# Altium footprint library LukaLIBRARY.PcbLib: 784 footprints (part 18 of 49)
Each footprint in its own frame and in the unit in brackets; x right, y up, seen from the top. Pads: shape width x height; smd on the part's side, far side on the other; paste and mask are expansions set on the pad; w line width, h text height; cw(c..) or ccw(c..) is an arc to the next point about the centre after c.
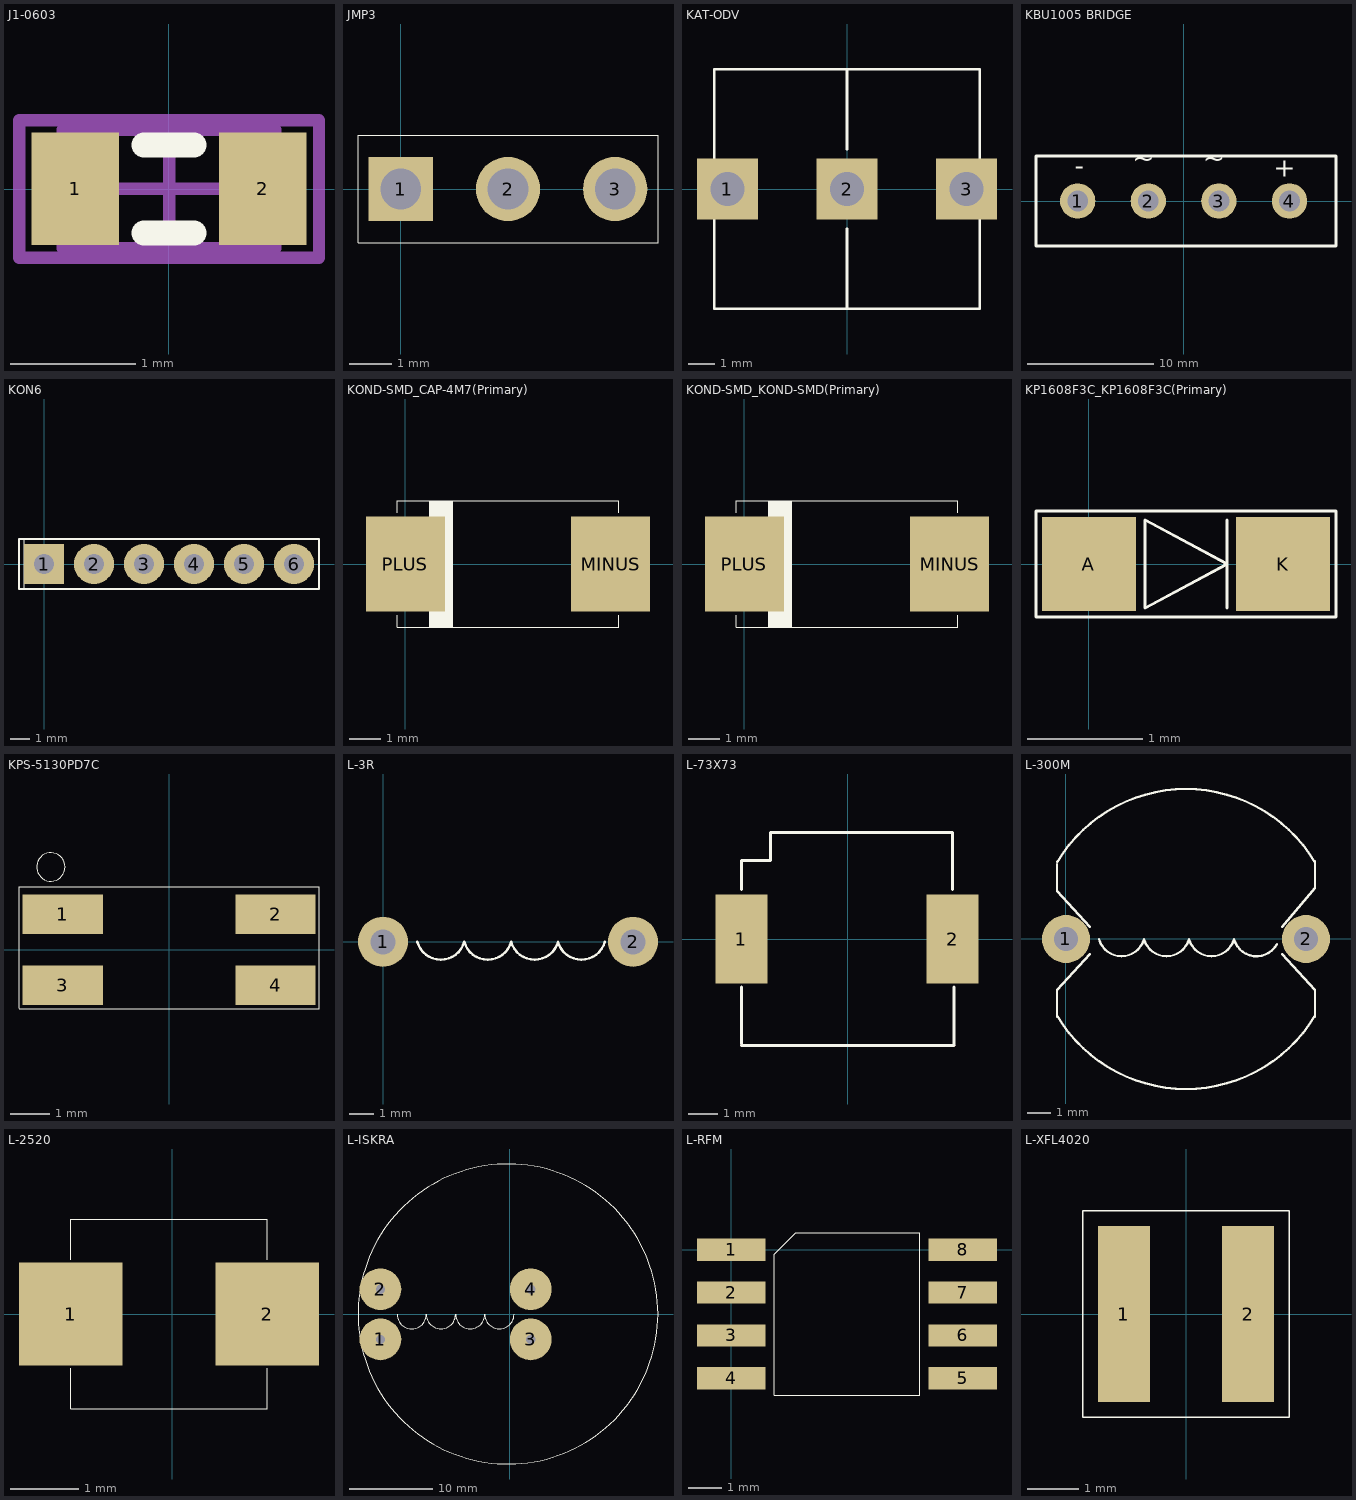
[diagram p17: the footprints below, top view; thin cyan lines are the x and y axes]

## J1-0603 [mm] "Chip Resistor, Body 1.6x0.8mm, IPC High Density"
height 0.9
pads (2):
  rect 0.7x0.9 smd: 1(-0.75,0) 2(0.75,0)
Top Overlay:
  lines w0.2: -0.2,-0.35 0.2,-0.35 ; -0.2,0.35 0.2,0.35
Mechanical 13:
  lines w0.1: -0.85,-0.475 0.85,-0.475 0.85,0.475 -0.85,0.475 -0.85,-0.475
Mechanical 15:
  lines w0.1: -0.475,0 0.475,0 ; 0,-0.475 0,0.475 ; -1.2,-0.55 1.2,-0.55 1.2,0.55 -1.2,0.55 -1.2,-0.55
3D body: height 0.9, standoff 0, extent -0.85,-0.475 0.85,0.475

## JMP3 [mil]
pads (3):
  rect 60x60 hole 38 mask-1000: 1(0,0)
  round 60 hole 38 mask-1000: 2(100,0) 3(200,0)
Top Overlay:
  lines w1: -40,-50 240,-50 240,50 -40,50 -40,-50
Top Solder:
  region: 100,30.26 92.17,29.23 84.87,26.2 78.6,21.4 73.8,15.13 70.77,7.83 69.74,0 70.77,-7.83 73.8,-15.13 78.6,-21.4 84.87,-26.2 92.17,-29.23 100,-30.26 107.83,-29.23 115.13,-26.2 121.4,-21.4 126.2,-15.13 129.23,-7.83 130.26,0 129.23,7.83 126.2,15.13 121.4,21.4 115.13,26.2 107.83,29.23
  region: 200,30.26 192.17,29.23 184.87,26.2 178.6,21.4 173.79,15.13 170.77,7.83 169.74,0 170.77,-7.83 173.79,-15.13 178.6,-21.4 184.87,-26.2 192.17,-29.23 200,-30.26 207.83,-29.23 215.13,-26.2 221.4,-21.4 226.21,-15.13 229.23,-7.83 230.26,0 229.23,7.83 226.21,15.13 221.4,21.4 215.13,26.2 207.83,29.23
  region: -30,-30 30,-30 30,30 -30,30
Bottom Solder:
  region: 100,30.26 92.17,29.23 84.87,26.2 78.6,21.4 73.8,15.13 70.77,7.83 69.74,0 70.77,-7.83 73.8,-15.13 78.6,-21.4 84.87,-26.2 92.17,-29.23 100,-30.26 107.83,-29.23 115.13,-26.2 121.4,-21.4 126.2,-15.13 129.23,-7.83 130.26,0 129.23,7.83 126.2,15.13 121.4,21.4 115.13,26.2 107.83,29.23
  region: 200,30.26 192.17,29.23 184.87,26.2 178.6,21.4 173.79,15.13 170.77,7.83 169.74,0 170.77,-7.83 173.79,-15.13 178.6,-21.4 184.87,-26.2 192.17,-29.23 200,-30.26 207.83,-29.23 215.13,-26.2 221.4,-21.4 226.21,-15.13 229.23,-7.83 230.26,0 229.23,7.83 226.21,15.13 221.4,21.4 215.13,26.2 207.83,29.23
  region: -30,-30 30,-30 30,30 -30,30

## KAT-ODV [mil]
pads (3):
  rect 90x90 hole 50 mask-1000: 1(-177.17,0) 2(0,0) 3(177.17,0)
Top Overlay:
  lines w3.94: 0,-177.17 0,-59.06 ; 0,59.06 0,177.17 ; -196.85,-177.17 -196.85,177.17 196.85,177.17 196.85,-177.17 -196.85,-177.17
Top Solder:
  region: -222.17,-45 -132.17,-45 -132.17,45 -222.17,45
  region: -45,-45 45,-45 45,45 -45,45
  region: 132.17,-45 222.17,-45 222.17,45 132.17,45
Bottom Solder:
  region: -222.17,-45 -132.17,-45 -132.17,45 -222.17,45
  region: -45,-45 45,-45 45,45 -45,45
  region: 132.17,-45 222.17,-45 222.17,45 132.17,45

## KBU1005 BRIDGE [mil]
pads (4):
  round 110 hole 65: 1(-330,0) 2(-110,0) 3(110,0) 4(330,0)
Top Overlay:
  lines w10: -460,-140 -460,140 475,140 475,-140 -460,-140
  text "~" at 130,155 h60
  text "~" at -90,155 h60
  text "+" at 350,125 h60
  text "-" at -310,125 h60

## KON6 [mil]
pads (6):
  rect 80x80 hole 40 mask-1000: 1(0,0)
  round 80 hole 40 mask-1000: 2(100,0) 3(200,0) 4(300,0) 5(400,0) 6(500,0)
Top Overlay:
  lines w1: -40,-50 -40,50
  lines w3.94: -50,-50 550,-50 550,50 -50,50 -50,-50
Top Solder:
  region: 400,40.35 389.56,38.97 379.83,34.94 371.47,28.53 365.06,20.17 361.03,10.44 359.65,0 361.03,-10.44 365.06,-20.17 371.47,-28.53 379.83,-34.94 389.56,-38.97 400,-40.35 410.44,-38.97 420.17,-34.94 428.53,-28.53 434.94,-20.17 438.97,-10.44 440.35,0 438.97,10.44 434.94,20.17 428.53,28.53 420.17,34.94 410.44,38.97
  region: 100,40.35 89.56,38.97 79.83,34.94 71.47,28.53 65.06,20.17 61.03,10.44 59.65,0 61.03,-10.44 65.06,-20.17 71.47,-28.53 79.83,-34.94 89.56,-38.97 100,-40.35 110.44,-38.97 120.17,-34.94 128.53,-28.53 134.94,-20.17 138.97,-10.44 140.35,0 138.97,10.44 134.94,20.17 128.53,28.53 120.17,34.94 110.44,38.97
  region: 500,40.35 489.56,38.97 479.83,34.94 471.47,28.53 465.06,20.17 461.03,10.44 459.65,0 461.03,-10.44 465.06,-20.17 471.47,-28.53 479.83,-34.94 489.56,-38.97 500,-40.35 510.44,-38.97 520.17,-34.94 528.53,-28.53 534.94,-20.17 538.97,-10.44 540.35,0 538.97,10.44 534.94,20.17 528.53,28.53 520.17,34.94 510.44,38.97
  region: 300,40.35 289.56,38.97 279.83,34.94 271.47,28.53 265.06,20.17 261.03,10.44 259.65,0 261.03,-10.44 265.06,-20.17 271.47,-28.53 279.83,-34.94 289.56,-38.97 300,-40.35 310.44,-38.97 320.17,-34.94 328.53,-28.53 334.94,-20.17 338.97,-10.44 340.35,0 338.97,10.44 334.94,20.17 328.53,28.53 320.17,34.94 310.44,38.97
  region: 200,40.35 189.56,38.97 179.83,34.94 171.47,28.53 165.06,20.17 161.03,10.44 159.65,0 161.03,-10.44 165.06,-20.17 171.47,-28.53 179.83,-34.94 189.56,-38.97 200,-40.35 210.44,-38.97 220.17,-34.94 228.53,-28.53 234.94,-20.17 238.97,-10.44 240.35,0 238.97,10.44 234.94,20.17 228.53,28.53 220.17,34.94 210.44,38.97
  region: -40,-40 40,-40 40,40 -40,40
Bottom Solder:
  region: 400,40.35 389.56,38.97 379.83,34.94 371.47,28.53 365.06,20.17 361.03,10.44 359.65,0 361.03,-10.44 365.06,-20.17 371.47,-28.53 379.83,-34.94 389.56,-38.97 400,-40.35 410.44,-38.97 420.17,-34.94 428.53,-28.53 434.94,-20.17 438.97,-10.44 440.35,0 438.97,10.44 434.94,20.17 428.53,28.53 420.17,34.94 410.44,38.97
  region: 100,40.35 89.56,38.97 79.83,34.94 71.47,28.53 65.06,20.17 61.03,10.44 59.65,0 61.03,-10.44 65.06,-20.17 71.47,-28.53 79.83,-34.94 89.56,-38.97 100,-40.35 110.44,-38.97 120.17,-34.94 128.53,-28.53 134.94,-20.17 138.97,-10.44 140.35,0 138.97,10.44 134.94,20.17 128.53,28.53 120.17,34.94 110.44,38.97
  region: 500,40.35 489.56,38.97 479.83,34.94 471.47,28.53 465.06,20.17 461.03,10.44 459.65,0 461.03,-10.44 465.06,-20.17 471.47,-28.53 479.83,-34.94 489.56,-38.97 500,-40.35 510.44,-38.97 520.17,-34.94 528.53,-28.53 534.94,-20.17 538.97,-10.44 540.35,0 538.97,10.44 534.94,20.17 528.53,28.53 520.17,34.94 510.44,38.97
  region: 300,40.35 289.56,38.97 279.83,34.94 271.47,28.53 265.06,20.17 261.03,10.44 259.65,0 261.03,-10.44 265.06,-20.17 271.47,-28.53 279.83,-34.94 289.56,-38.97 300,-40.35 310.44,-38.97 320.17,-34.94 328.53,-28.53 334.94,-20.17 338.97,-10.44 340.35,0 338.97,10.44 334.94,20.17 328.53,28.53 320.17,34.94 310.44,38.97
  region: 200,40.35 189.56,38.97 179.83,34.94 171.47,28.53 165.06,20.17 161.03,10.44 159.65,0 161.03,-10.44 165.06,-20.17 171.47,-28.53 179.83,-34.94 189.56,-38.97 200,-40.35 210.44,-38.97 220.17,-34.94 228.53,-28.53 234.94,-20.17 238.97,-10.44 240.35,0 238.97,10.44 234.94,20.17 228.53,28.53 220.17,34.94 210.44,38.97
  region: -40,-40 40,-40 40,40 -40,40

## KOND-SMD_CAP-4M7(Primary) [mil]
pads (2):
  rect 100x120 smd mask-1000: MINUS(260,0) PLUS(0,0)
Top Overlay:
  region: 30,80 30,-80 60,-80 60,80
  lines w1: -10,-65 -10,-80 270,-80 270,-65 ; -10,65 -10,80 270,80 270,65
Top Solder:
  region: 50,-60 50,60 -50,60 -50,-60
  region: 310,-60 310,60 210,60 210,-60

## KOND-SMD_KOND-SMD(Primary) [mil]
pads (2):
  rect 100x120 smd mask-1000: MINUS(260,0) PLUS(0,0)
Top Overlay:
  region: 30,80 30,-80 60,-80 60,80
  lines w1: -10,-65 -10,-80 270,-80 270,-65 ; -10,65 -10,80 270,80 270,65
Top Solder:
  region: 50,-60 50,60 -50,60 -50,-60
  region: 310,-60 310,60 210,60 210,-60

## KP1608F3C_KP1608F3C(Primary) [mil]
pads (2):
  rect 32x32 smd mask-1000: A(0,0) K(66,0)
Top Overlay:
  lines w1: 47,-15 47,15 ; -18,-18 84,-18 84,18 -18,18 -18,-18 ; 19,-15 47,0 19,15 19,-15
Top Solder:
  region: -16,-16 16,-16 16,16 -16,16
  region: 50,-16 82,-16 82,16 50,16

## KPS-5130PD7C [mm]
pads (4):
  rect 2.032x1 smd mask-25.4: 1(-2.7,0.9) 2(2.7,0.9) 3(-2.7,-0.9) 4(2.7,-0.9)
Top Overlay:
  circle w0.025: c-3,2.1 r0.361
  lines w0.025: -3.808,-1.478 -3.8,1.6 3.8,1.6 3.8,-1.5 -3.8,-1.5
Top Solder:
  region: 1.684,0.4 3.716,0.4 3.716,1.4 1.684,1.4
  region: 1.684,-1.4 3.716,-1.4 3.716,-0.4 1.684,-0.4
  region: -3.716,0.4 -1.684,0.4 -1.684,1.4 -3.716,1.4
  region: -3.716,-1.4 -1.684,-1.4 -1.684,-0.4 -3.716,-0.4

## L-3R [mil]
pads (2):
  round 80 hole 40: 1(0,0) 2(400,0)
Top Overlay:
  lines w3.94: 54.99,0.02 ccw(c92.5,10) 130.01,0.02 ccw(c167.5,10) 205.01,0.02 ccw(c242.5,10) 280.01,0.02 ccw(c317.5,10) 355.01,0.02

## L-73X73 [mil]
pads (2):
  rect 70x120 smd: 1(-143.7,0) 2(141.73,0)
Top Layer:
  lines w3.94: 0,-143.7 -143.7,-143.7 143.7,-143.7
Top Overlay:
  lines w3.94: -143.7,-143.7 143.7,-143.7 143.7,-64.96 ; -143.7,-141.73 -143.7,-64.96 ; -143.7,66.93 -143.7,106.3 -104.33,106.3 -104.33,143.7 141.73,143.7 141.73,66.93

## L-300M [mil]
pads (2):
  round 80 hole 40: 1(0,0) 2(400,0)
Top Overlay:
  lines w3.94: -15,-130 -15,-85 40,-25 ; -15,125 -15,80 40,20 ; -14.29,-128.76 ccw(c200,0) 414.29,-128.76 ; -14.29,128.76 cw(c200,0) 414.29,128.76 ; 54.99,0.02 ccw(c92.5,10) 130.01,0.02 ccw(c167.5,10) 205.01,0.02 ccw(c242.5,10) 280.01,0.02 ccw(c317.5,10) 351.58,-8.58 ; 360,-25 415,-85 415,-130 ; 360,20 415,85 415,130

## L-2520 [mil]
pads (2):
  rect 60x60 smd mask-1000: 1(-59.06,0) 2(55.12,0)
Top Overlay:
  lines w0.04: -59.06,-31.5 -59.06,-55.12 55.12,-55.12 55.12,-31.5 ; -59.06,31.5 -59.06,55.12 55.12,55.12 55.12,31.5
Top Solder:
  region: -89.06,-30 -29.06,-30 -29.06,30 -89.06,30
  region: 25.12,-30 85.12,-30 85.12,30 25.12,30

## L-ISKRA [mm]
pads (4):
  round 5 hole 1.1: 1(-15.5,-3) 2(-15.5,3) 3(2.5,-3) 4(2.5,3)
Top Overlay:
  circle w0.076: c-0.22,0.04 r17.966
  lines w0.076: -13.5,0 ccw(c-11.75,0) -10,0 ccw(c-8.25,0) -6.5,0 ccw(c-4.75,0) -3,0 ccw(c-1.25,0) 0.5,0

## L-RFM [mil]
pads (8):
  rect 80x26 smd mask-1000: 1(0,0) 2(0,-50) 3(0,-100) 4(0,-150) 5(270,-150) 6(270,-100) 7(270,-50) 8(270,0)
Top Overlay:
  lines w1: 50,-170 220,-170 220,20 75,20 50,-5 50,-170
Top Solder:
  region: 230,-13 310,-13 310,13 230,13
  region: -40,-13 40,-13 40,13 -40,13
  region: 230,-113 310,-113 310,-87 230,-87
  region: 230,-63 310,-63 310,-37 230,-37
  region: 230,-163 310,-163 310,-137 230,-137
  region: -40,-113 40,-113 40,-87 -40,-87
  region: -40,-63 40,-63 40,-37 -40,-37
  region: -40,-163 40,-163 40,-137 -40,-137

## L-XFL4020 [mm]
pads (2):
  rect 1x3.4 smd mask-25.4: 1(-1.2,0) 2(1.2,0)
Top Overlay:
  lines w0.03: -2,-2 -2,2 2,2 2,-2 -2,-2
Top Solder:
  region: -0.7,-1.7 -0.7,1.7 -1.7,1.7 -1.7,-1.7
  region: 1.7,-1.7 1.7,1.7 0.7,1.7 0.7,-1.7